# Altium footprint library lib.PcbLib: 145 footprints (part 5 of 10)
Each footprint in its own frame and in the unit in brackets; x right, y up, seen from the top. Pads: shape width x height; smd on the part's side, far side on the other; paste and mask are expansions set on the pad; w line width, h text height; cw(c..) or ccw(c..) is an arc to the next point about the centre after c.
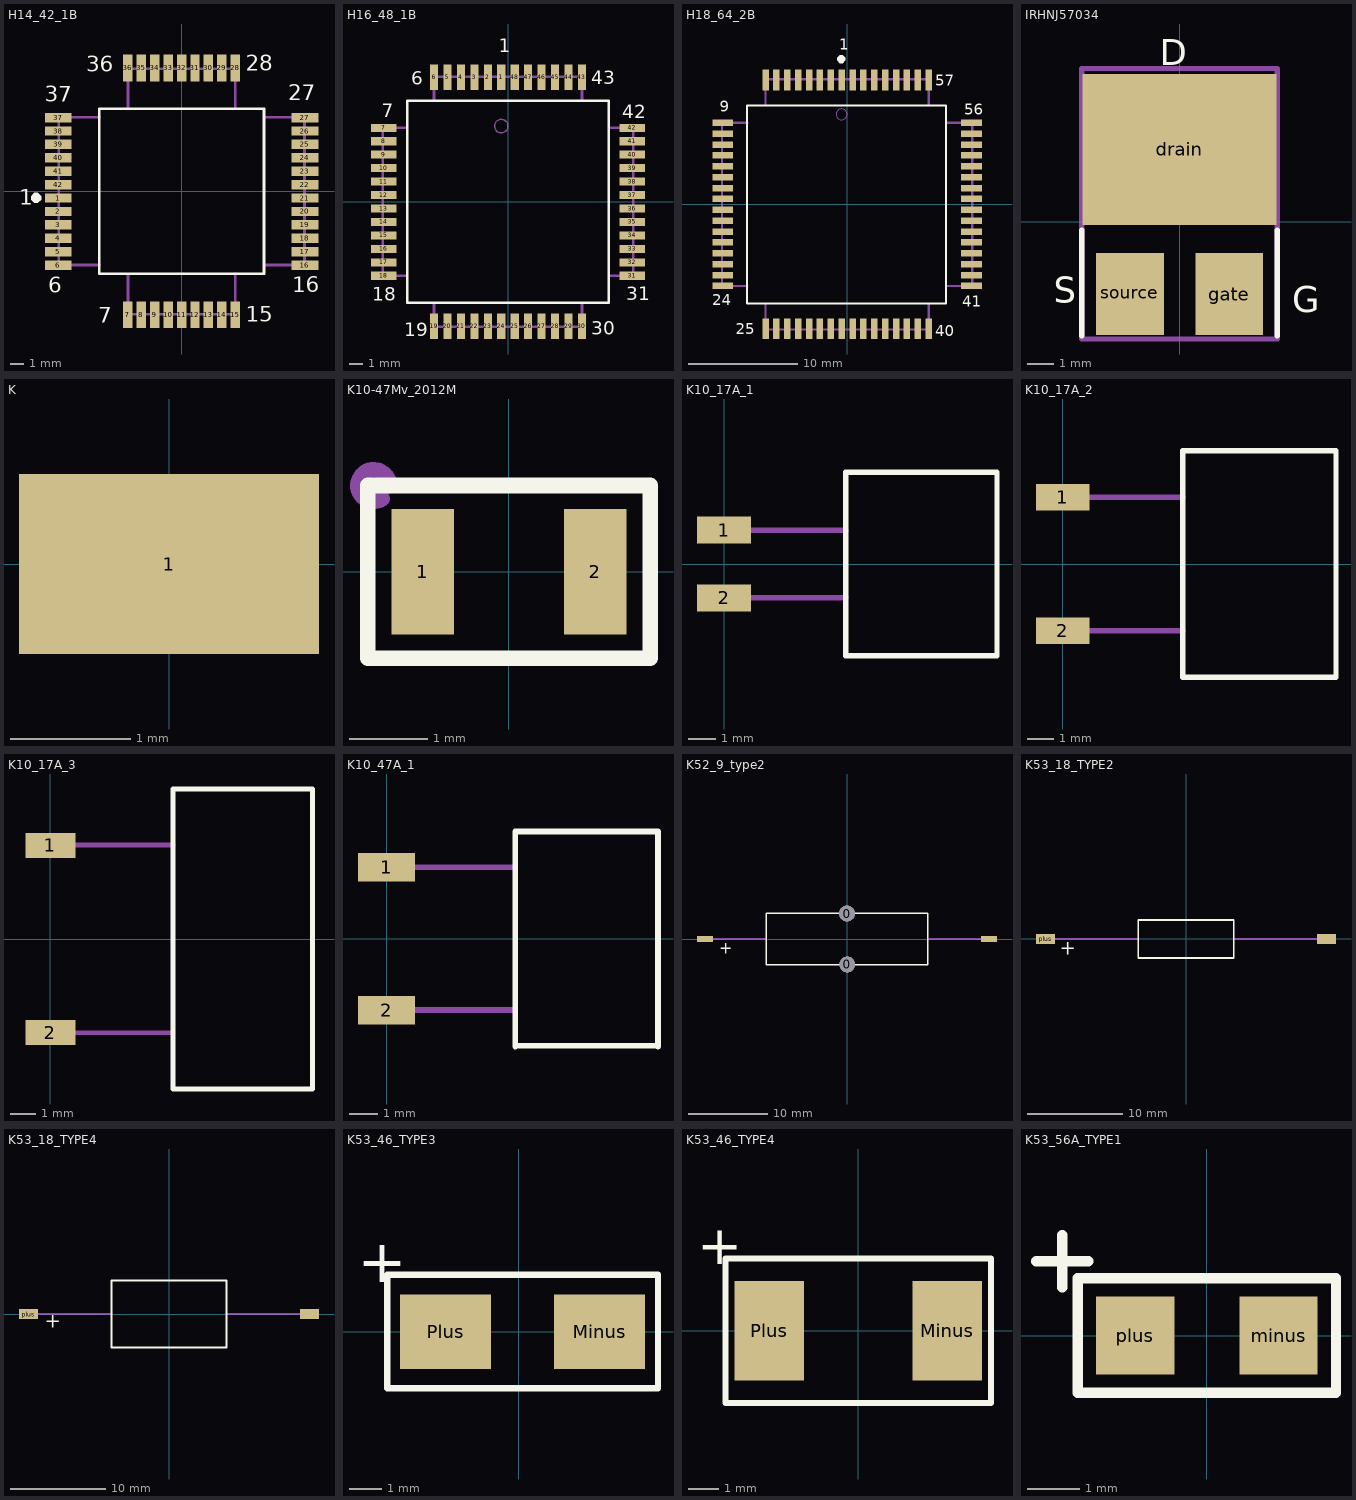
[diagram p4: the footprints below, top view; thin cyan lines are the x and y axes]

## H14_42_1B [mm] "Form 44и.3268.193  Install 46б massa 1.5, прокладка СЛИЮ.754141.245"
height 3
pads (42):
  rect 2x0.7 smd: 1(-9.2,-0.5) 2(-9.2,-1.5) 3(-9.2,-2.5) 4(-9.2,-3.5) 5(-9.2,-4.5) 6(-9.2,-5.5) 16(9.2,-5.5) 17(9.2,-4.5) 18(9.2,-3.5) 19(9.2,-2.5) 20(9.2,-1.5) 21(9.2,-0.5) 22(9.2,0.5) 23(9.2,1.5) 24(9.2,2.5) 25(9.2,3.5) 26(9.2,4.5) 27(9.2,5.5) 37(-9.2,5.5) 38(-9.2,4.5) 39(-9.2,3.5) 40(-9.2,2.5) 41(-9.2,1.5) 42(-9.2,0.5)
  rect 0.7x2 smd: 7(-4,-9.2) 8(-3,-9.2) 9(-2,-9.2) 10(-1,-9.2) 11(0,-9.2) 12(1,-9.2) 13(2,-9.2) 14(3,-9.2) 15(4,-9.2) 28(4,9.2) 29(3,9.2) 30(2,9.2) 31(1,9.2) 32(0,9.2) 33(-1,9.2) 34(-2,9.2) 35(-3,9.2) 36(-4,9.2)
Top Overlay:
  region: -11.225,-0.61 -10.975,-0.86 -10.725,-0.86 -10.475,-0.61 -10.475,-0.36 -10.725,-0.11 -10.975,-0.11 -11.225,-0.36
  lines w0.2: -6.15,-6.15 -6.15,6.15 6.15,6.15 6.15,-6.15 -6.15,-6.15
  text "6" at -9.95,-7.975 h2
  text "7" at -6.2,-10.225 h2
  text "15" at 4.8,-10.125 h2
  text "16" at 8.25,-7.925 h2
  text "27" at 7.975,6.375 h2
  text "28" at 4.775,8.575 h2
  text "36" at -7.1,8.525 h2
  text "37" at -10.2,6.275 h2
  text "1" at -12.125,-1.4 h2
Mechanical 5:
  lines w0.2: -6.15,-5.5 -9.15,-5.5 -9.15,5.525 -6.15,5.525 ; -4,-6.175 -4,-9.175 4,-9.175 ; -4,6.15 -4,9.15 4,9.15 ; 4,-9.15 4,-6.15 ; 4,6.175 4,9.175 ; 6.175,-5.5 9.175,-5.5 9.175,5.525 6.175,5.525
Mechanical 25:
  text "1" at -7.75,-1.075 h2
  text "37" at -7.75,4.75 h2
  text "36" at -4.7,6.35 h2
  text "27" at 6,4.775 h2
  text "16" at 5.95,-6.05 h2
  text "15" at 3.225,-7.45 h2
  text "7" at -4.1,-7.625 h2
  text "6" at -7.65,-6.275 h2
  text "28" at 3.05,6.55 h2
3D body "QFP100P1830X1830X300-42M.step": height 3, standoff 0, extent -9.15,-9.15 9.15,9.15

## H16_48_1B [mm] "5572ИН1(А)"
height 4.2
pads (48):
  rect 0.6x1.9 smd: 1(-0.5,9.25) 2(-1.5,9.25) 3(-2.5,9.25) 4(-3.5,9.25) 5(-4.5,9.25) 6(-5.5,9.25) 19(-5.5,-9.25) 20(-4.5,-9.25) 21(-3.5,-9.25) 22(-2.5,-9.25) 23(-1.5,-9.25) 24(-0.5,-9.25) 25(0.5,-9.25) 26(1.5,-9.25) 27(2.5,-9.25) 28(3.5,-9.25) 29(4.5,-9.25) 30(5.5,-9.25) 43(5.5,9.25) 44(4.5,9.25) 45(3.5,9.25) 46(2.5,9.25) 47(1.5,9.25) 48(0.5,9.25)
  rect 1.9x0.6 smd: 7(-9.25,5.5) 8(-9.25,4.5) 9(-9.25,3.5) 10(-9.25,2.5) 11(-9.25,1.5) 12(-9.25,0.5) 13(-9.25,-0.5) 14(-9.25,-1.5) 15(-9.25,-2.5) 16(-9.25,-3.5) 17(-9.25,-4.5) 18(-9.25,-5.5) 31(9.25,-5.5) 32(9.25,-4.5) 33(9.25,-3.5) 34(9.25,-2.5) 35(9.25,-1.5) 36(9.25,-0.5) 37(9.25,0.5) 38(9.25,1.5) 39(9.25,2.5) 40(9.25,3.5) 41(9.25,4.5) 42(9.25,5.5)
Top Overlay:
  lines w0.2: -7.5,-7.5 7.5,-7.5 7.5,7.5 -7.5,7.5 -7.5,-7.5
  text "1" at -0.7,11.1 h1
  text "6" at -7.2,8.7 h1
  text "7" at -9.4,6.3 h1
  text "18" at -10.075,-7.375 h1
  text "19" at -7.725,-10 h1
  text "30" at 6.2,-9.9 h1
  text "31" at 8.8,-7.325 h1
  text "42" at 8.5,6.2 h1
  text "43" at 6.2,8.75 h1
Mechanical 5:
  lines w0.2: -7.6,-5.5 -9.3,-5.5 -9.3,5.5 -7.55,5.5 ; -5.5,-7.55 -5.5,-9.3 5.5,-9.3 5.5,-7.6 ; -5.5,7.6 -5.5,9.3 5.5,9.3 5.5,7.55 ; 7.6,-5.5 9.3,-5.5 9.3,5.5 7.6,5.5
Mechanical 25:
  circle w0.1: c-0.5,5.625 r0.5
  text "7" at -7.875,4.8 h2
  text "43" at 4.625,6.875 h2
  text "42" at 6.3,4.85 h2
  text "31" at 6.2,-6.275 h2
  text "30" at 4.625,-7.575 h2
  text "19" at -6.2,-7.425 h2
  text "18" at -7.675,-5.95 h2
  text "6" at -5.775,6.475 h2
  text "1" at -1.025,6.8 h2
3D body "5572.stp": height 3.6, standoff 0, extent -9.65,-9.65 9.65,9.65

## H18_64_2B [mm] "H1582ВЖ3В-0244, m<2.5г,прокладкаСТФ 1мм"
height 4.2
pads (64):
  rect 0.6x1.9 smd: 1(-0.5,11.425) 2(-1.5,11.425) 3(-2.5,11.425) 4(-3.5,11.425) 5(-4.5,11.425) 6(-5.5,11.425) 7(-6.5,11.425) 8(-7.5,11.425) 25(-7.5,-11.425) 26(-6.5,-11.425) 27(-5.5,-11.425) 28(-4.5,-11.425) 29(-3.5,-11.425) 30(-2.5,-11.425) 31(-1.5,-11.425) 32(-0.5,-11.425) 33(0.5,-11.425) 34(1.5,-11.425) 35(2.5,-11.425) 36(3.5,-11.425) 37(4.5,-11.425) 38(5.5,-11.425) 39(6.5,-11.425) 40(7.5,-11.425) 57(7.5,11.425) 58(6.5,11.425) 59(5.5,11.425) 60(4.5,11.425) 61(3.5,11.425) 62(2.5,11.425) 63(1.5,11.425) 64(0.5,11.425)
  rect 1.9x0.6 smd: 9(-11.425,7.5) 10(-11.425,6.5) 11(-11.425,5.5) 12(-11.425,4.5) 13(-11.425,3.5) 14(-11.425,2.5) 15(-11.425,1.5) 16(-11.425,0.5) 17(-11.425,-0.5) 18(-11.425,-1.5) 19(-11.425,-2.5) 20(-11.425,-3.5) 21(-11.425,-4.5) 22(-11.425,-5.5) 23(-11.425,-6.5) 24(-11.425,-7.5) 41(11.425,-7.5) 42(11.425,-6.5) 43(11.425,-5.5) 44(11.425,-4.5) 45(11.425,-3.5) 46(11.425,-2.5) 47(11.425,-1.5) 48(11.425,-0.5) 49(11.425,0.5) 50(11.425,1.5) 51(11.425,2.5) 52(11.425,3.5) 53(11.425,4.5) 54(11.425,5.5) 55(11.425,6.5) 56(11.425,7.5)
Top Overlay:
  region: -0.925,13.225 -0.675,12.975 -0.425,12.975 -0.175,13.225 -0.175,13.475 -0.425,13.725 -0.675,13.725 -0.925,13.475
  lines w0.2: -9.2,-9.1 -9.2,9.1 9.1,9.1 9.1,-9.1 -9.2,-9.1
  text "25" at -10.225,-11.95 h1
  text "40" at 8.1,-12.1 h1
  text "41" at 10.575,-9.4 h1
  text "56" at 10.775,8.25 h1
  text "57" at 8.1,10.9 h1
  text "1" at -0.725,14.2 h1
  text "24" at -12.4,-9.25 h1
  text "9" at -11.7,8.5 h1
Mechanical 5:
  lines w0.2: -9.175,-7.5 -11.5,-7.5 -11.5,7.5 -9.175,7.5 ; -7.5,-9.175 -7.5,-11.5 7.5,-11.5 ; -7.5,9.175 -7.5,11.5 7.5,11.5 7.5,9.175 ; 7.4,-11.4 7.5,-11.5 ; 7.5,-9.175 7.5,-11.5 ; 9.175,-7.5 11.4,-7.5 11.5,-7.4 11.5,7.5 9.175,7.5
Mechanical 25:
  circle w0.1: c-0.5,8.275 r0.5
  text "1" at -0.95,12.8 h2
  text "9" at -10.05,6.95 h2
  text "25" at -8.4,-10.075 h2
  text "40" at 6.625,-10.125 h2
  text "41" at 8.25,-8.025 h2
  text "56" at 8.175,6.8 h2
  text "57" at 7,8.875 h2
  text "24" at -10.1,-7.95 h2
  text "64" at 0,8.675 h2
3D body "h18_64_2b.stp": height 3.6, standoff 0, extent -11.9,-11.9 11.9,11.9

## IRHNJ57034 [mm] "SMD-05"
height 3.12
pads (3):
  rect 7.45x5.8 smd: drain(0,2.775)
  rect 2.6x3.15 smd: gate(1.905,-2.775) source(-1.905,-2.775)
Top Overlay:
  lines w0.2: -3.75,-4.375 -3.75,-0.325 ; 3.75,-4.375 3.75,-0.325
  text "D" at -0.762,6.009 h1
  text "G" at 4.318,-3.481 h1
  text "S" at -4.826,-3.1 h1
Top Paste:
  region: 1.558,5.425 1.558,3.219 3.375,3.219 3.375,5.425
  region: -1.442,3.219 -1.442,5.425 -3.375,5.425 -3.375,3.219
  region: 3.375,2.844 1.558,2.844 1.558,0.425 3.375,0.425
  region: -3.375,2.844 -3.375,0.425 -1.442,0.425 -1.442,2.844
  region: -1,5.425 -1,3.219 1,3.219 1,5.425
  region: -1,2.844 -1,0.425 1,0.425 1,2.844
Mechanical 5:
  lines w0.2: -3.75,-4.5 3.75,-4.5 3.75,5.875 -3.75,5.875 -3.75,-4.5
Mechanical 25:
  text "S" at -4.5,-3 h1.5
  text "G" at 3.625,-3.375 h1.5
  text "D" at -0.635,6.009 h1.5
3D body: height 0.4, standoff 0, extent 0.6,-4.3 3.1,-1.2
3D body: height 0.4, standoff 0, extent -3.1,-4.3 -0.6,-1.2
3D body: height 0.4, standoff 0, extent -3.65,-0.1 3.65,5.6
3D body: height 2.6, standoff 0.4, extent -3.7,-4.4 3.9,5.8

## K [mm]
height 0.5
pads (1):
  rect 2.5x1.5 smd: 1(0,0)
3D body: height 0.2, standoff 0, extent -1.25,-0.75 1.25,0.75

## K10-47Mv_2012M [mm] "m=0.2g"
height 1.4
pads (2):
  rect 0.8x1.6 smd: 1(-1.1,0) 2(1.1,0)
Top Overlay:
  lines w0.2: -1.8,-1.1 1.8,-1.1 1.8,1.1 -1.8,1.1 -1.8,0 -1.8,-1.1
Mechanical 25:
  lines w0.2: -1.619,0.93 cw(c-1.725,1.1) -1.525,1.1
3D body: height 1.4, standoff 0, extent -1,-0.6 1,0.6

## K10_17A_1 [mm] "m0.5g"
height 4.6
pads (2):
  rect 2x1 smd: 1(0,1.25) 2(0,-1.25)
Top Overlay:
  lines w0.2: 4.5,-3.4 10.1,-3.4 10.1,3.4 4.5,3.4 4.5,-3.4
Mechanical 5:
  lines w0.2: -0.6,-1.25 4.5,-1.25 ; -0.6,1.25 4.5,1.25
Mechanical 25:
  text "2" at 1.375,-1.875 h2
  text "1" at 1.375,0.75 h2

## K10_17A_2 [mm] "m1g"
height 6.7
pads (2):
  rect 2x1 smd: 1(0,2.5) 2(0,-2.5)
Top Overlay:
  lines w0.2: 4.5,-4.25 4.5,4.25 10.25,4.25 10.25,-4.25 4.5,-4.25
Mechanical 5:
  lines w0.2: -0.5,-2.5 4.5,-2.5 ; -0.5,2.5 4.5,2.5
Mechanical 25:
  text "1" at 1.5,1.875 h2
  text "2" at 1.5,-3 h2

## K10_17A_3 [mm] "m2g"
height 8.6
pads (2):
  rect 2x1 smd: 1(0,3.75) 2(0,-3.75)
Top Overlay:
  lines w0.2: 4.9,-6 10.5,-6 10.5,6 4.9,6 4.9,-6
Mechanical 5:
  lines w0.2: 0.075,-3.75 4.875,-3.75 ; 0.1,3.75 4.9,3.75
Mechanical 25:
  text "2" at 1.5,-4.375 h2
  text "1" at 1.625,3.125 h2

## K10_47A_1 [mm] "m0.7g"
height 5.3
pads (2):
  rect 2x1 smd: 1(0,2.5) 2(0,-2.5)
Top Overlay:
  lines w0.2: 4.5,-3.775 4.5,3.75 9.5,3.75 9.5,-3.775 ; 4.5,-3.75 9.5,-3.75
Mechanical 5:
  lines w0.2: -0.5,-2.5 4.5,-2.5 ; -0.5,2.5 4.5,2.5
Mechanical 25:
  text "2" at 1.5,-3 h2
  text "1" at 1.5,1.875 h2

## K52_9_type2 [mm] "m6.5"
height 6
pads (4):
  round 2 hole 2 unplated: 0(0,3.225) 0(0.025,-3.225)
  rect 2x0.8 smd: minus(18,0) plus(-18,0)
Top Overlay:
  lines w0.2: -10.25,-3.25 -10.25,3.25 10.25,3.25 10.25,-3.25 -10.25,-3.25
  text "+" at -16.2,-1.9 h1.5
Mechanical 5:
  lines w0.2: -18,0 -10.25,0 ; 10.35,0 18,0
Mechanical 25:
  text "+" at -16.4,-1.4 h2

## K53_18_TYPE2 [mm] "m1.2g"
height 4
pads (2):
  rect 2x1 smd: minus(14.7,0) plus(-14.7,0)
Top Overlay:
  lines w0.2: -5,-2 -5,2 5,2 5,-2 -5,-2
  text "+" at -13.2,-1.65 h1.5
Mechanical 5:
  lines w0.2: -14.7,0 -5,0 ; 5,0 14.7,0
  text "+" at -13.325,-0.5 h2

## K53_18_TYPE4 [mm] "m4.5g"
height 7
pads (2):
  rect 2x1 smd: minus(14.7,0) plus(-14.7,0)
Top Overlay:
  lines w0.2: -6,-3.5 -6,3.5 6,3.5 6,-3.5 -6,-3.5
  text "+" at -13,-1.45 h1.5
Mechanical 5:
  lines w0.2: -14.7,0 -6,0 ; 6,0 14.7,0
  text "+" at -13.55,-1.35 h2

## K53_46_TYPE3 [mm]
pads (2):
  rect 2.8x2.3 smd: Minus(2.5,0) Plus(-2.25,0)
Top Overlay:
  lines w0.2: -4.05,-1.75 4.3,-1.75 4.3,1.75 -4.05,1.75 -4.05,-1.75
  text "+" at -4.953,1.524 h1.31
3D body: height 2.5, standoff 0, extent -3.2,-1.6 -2.1,1.6
3D body: height 2.5, standoff 0, extent -2.1,-1.6 3.2,1.6

## K53_46_TYPE4 [mm]
height 2.8
pads (2):
  rect 2.3x3.3 smd: Minus(2.95,0) Plus(-2.95,0)
Top Overlay:
  lines w0.2: -4.4,-2.4 -4.4,2.4 4.4,2.4 4.4,-2.4 -4.4,-2.4
  text "+" at -5.35,2.2 h1.31
Mechanical 25:
  text "+" at -4.9,1.55 h2
3D body: height 2, standoff 0, extent 3.3,-1.5 3.5,1.5
3D body: height 2.5, standoff 0, extent -3.3,-2.3 3.3,2.3
3D body: height 2, standoff 0, extent -3.5,-1.5 -3.3,1.5

## K53_56A_TYPE1 [mm] "install14 massa 0.05"
height 1.6
pads (2):
  rect 1.5x1.5 smd: minus(1.375,0) plus(-1.375,0)
Top Overlay:
  lines w0.2: -3.275,1.425 -2.275,1.425 ; -2.775,0.925 -2.775,1.925 ; -2.475,-1.1 2.475,-1.1 2.475,1.1 -2.475,1.1 -2.475,-1.1
Mechanical 25:
  text "+" at -2.8,0.4 h2
3D body: height 1.6, standoff 0, extent -1.6,-0.8 -1.4,0.8
3D body: height 1.6, standoff 0, extent -1.4,-0.8 1.6,0.8